# Altium footprint library 1MaxPcb.PcbLib: 187 footprints (part 9 of 12)
Each footprint in its own frame and in the unit in brackets; x right, y up, seen from the top. Pads: shape width x height; smd on the part's side, far side on the other; paste and mask are expansions set on the pad; w line width, h text height; cw(c..) or ccw(c..) is an arc to the next point about the centre after c.
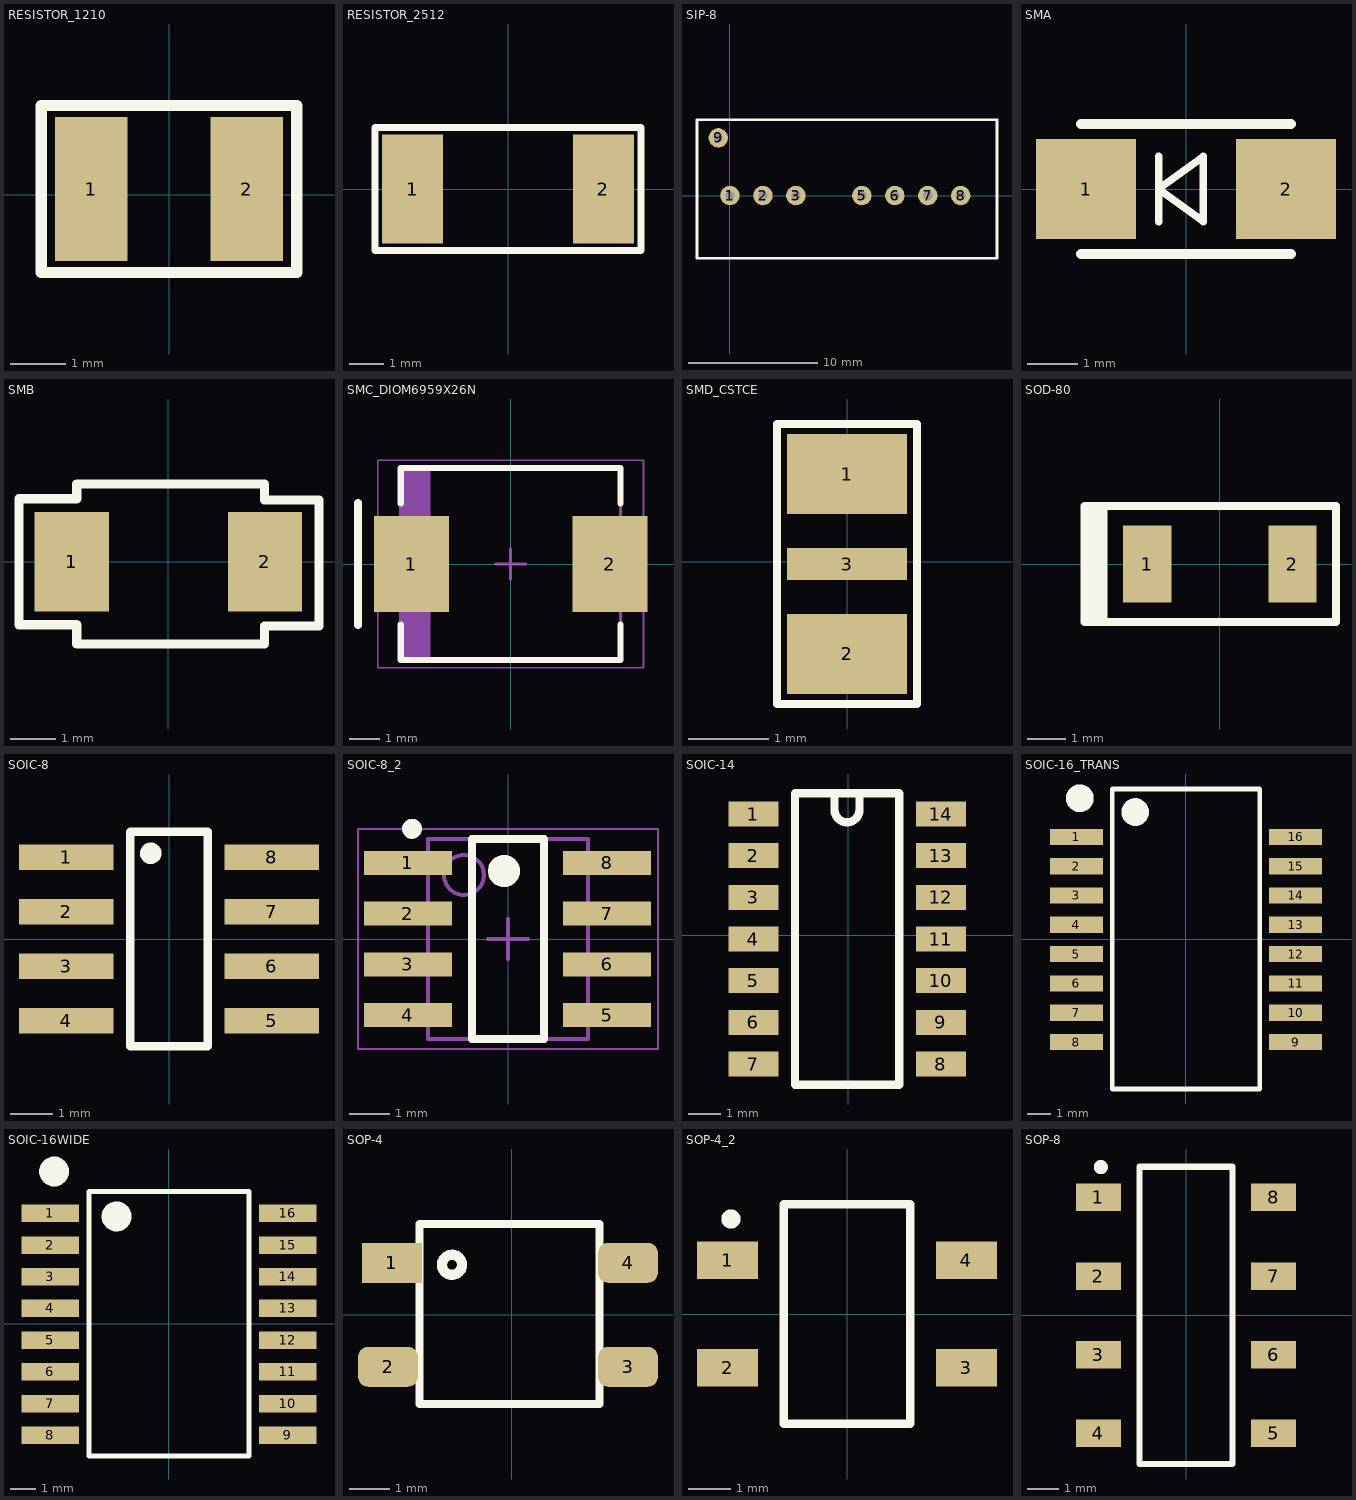
[diagram p8: the footprints below, top view; thin cyan lines are the x and y axes]

## RESISTOR_1210 [mm]
height 0.55
pads (2):
  rect 1.3x2.6 smd mask+0.05: 1(-1.4,0.1) 2(1.4,0.1)
Top Overlay:
  lines w0.2: -2.3,-1.4 -2.3,1.6 2.3,1.6 2.3,-1.4 -2.3,-1.4
3D body "res1210.step": height 0.57, standoff 0, extent -1.55,-1.2 1.55,1.402

## RESISTOR_2512 [mm]
height 0.55
pads (2):
  rect 1.8x3.2 smd mask+0.03: 1(-2.8,0) 2(2.8,0)
Top Overlay:
  lines w0.2: -3.9,-1.8 -3.9,1.8 3.9,1.8 3.9,-1.8 -3.9,-1.8
3D body "res2512.STEP": height 0.57, standoff 0, extent -3.2,-1.6 3.15,1.602

## SIP-8 [mm]
pads (8):
  round 1.5 hole 0.7: 1(0,0) 2(2.54,0) 3(5.08,0) 5(10.16,0) 6(12.7,0) 7(15.24,0) 8(17.78,0) 9(-0.9,4.45)
Top Overlay:
  lines w0.2: -2.54,-4.826 -2.54,5.842 20.574,5.842 20.574,-4.826 -2.54,-4.826
3D body "mdm10h.stp": height 12.2, standoff -2.2, extent -2.108,-4.492 20.192,5.508

## SMA [mm]
pads (2):
  rect 2x2 smd: 1(-2,0) 2(2,0)
Top Overlay:
  lines w0.15: -0.55,-0.65 -0.55,0.65 ; -0.55,0 0.35,0.65 0.35,-0.65 -0.55,0
  lines w0.2: -2.1,-1.3 2.1,-1.3 ; -2.1,1.3 2.1,1.3
3D body "SMA.STEP": height 2.4, standoff 0, extent -2.8,-1.45 2.8,1.45

## SMB [mm]
height 2.45
pads (2):
  rect 1.62x2.18 smd: 1(-2.11,0) 2(2.11,0)
Top Overlay:
  lines w0.2: -3.26,-1.375 -3.26,1.375 -2,1.375 -2,1.7 2.1,1.7 2.1,1.35 3.29,1.35 3.29,-1.4 2.1,-1.4 2.1,-1.8 -2,-1.8 -2,-1.375 -3.26,-1.375
3D body "SMB.STEP": height 2.4, standoff 0, extent -2.75,-1.9 2.85,1.9

## SMC_DIOM6959X26N [mm] "Molded Diode, 2-Leads, Body 6,90x5,90mm, IPC Medium Density"
height 2.62
pads (2):
  rect 2.45x3.15 smd: 1(-3.25,0) 2(3.25,0)
Top Overlay:
  lines w0.2: -3.6,-1.975 -3.6,-3.15 3.6,-3.15 3.6,-1.975 ; -3.6,1.975 -3.6,3.15 3.6,3.15 3.6,1.975
  lines w0.254: -5,-2 -5,2
Mechanical 13:
  rectangle: -3.6,-3.125 -2.632,3.125
  lines w0.1: -3.6,-3.125 -3.6,3.125 3.6,3.125 3.6,-3.125 -3.6,-3.125
Mechanical 15:
  lines w0.05: -4.35,-3.4 -4.35,3.4 4.35,3.4 4.35,-3.4 -4.35,-3.4
  lines w0.1: -0.5,0 0.5,0 ; 0,-0.5 0,0.5
3D body "SMC_DO-214AB.step": height 2.4, standoff 0.03, extent -4.065,-3.05 4.065,3.05

## SMD_CSTCE [mm]
pads (3):
  rect 1.5x1 smd: 1(0,1.1) 2(0,-1.15)
  rect 1.5x0.4 smd: 3(0,-0.025)
Top Overlay:
  lines w0.1: -0.875,-1.775 -0.875,1.725 0.875,1.725 0.875,-1.775 -0.875,-1.775

## SOD-80 [mm]
height 2.67
pads (2):
  rect 1.25x2 smd: 1(-1.875,0) 2(1.875,0)
Top Overlay:
  region: -3.5,1.5 -3.5,-1.5 -3,-1.5 -3,1.5
  lines w0.2: -3,-1.5 -3.5,-1.5 -3.5,1.5 -3,1.5 ; -3,-1.5 3,-1.5 3,1.5 -3,1.5 ; -3,-1.5 -3,1.5
3D body "SOD-80 MiniMELF.stp": height 1.57, standoff -0.03, extent -1.85,-0.8 1.85,0.8

## SOIC-8 [mm]
height 1.73
pads (8):
  rect 2.2x0.6 smd: 1(-2.4,1.905) 2(-2.4,0.635) 3(-2.4,-0.635) 4(-2.4,-1.905) 5(2.4,-1.905) 6(2.4,-0.635) 7(2.4,0.635) 8(2.4,1.905)
Top Overlay:
  circle w0.25: c-0.425,2 r0.125
  lines w0.2: -0.9,-2.5 -0.9,2.5 0.9,2.5 0.9,-2.5 -0.9,-2.5
3D body "SOIC-8.STEP": height 1.7, standoff 0, extent -2.975,-2.54 3.025,2.54

## SOIC-8_2 [mm] "SOIC, 8-Leads, Body 4.9x3.9mm, Pitch 1.27mm, IPC Medium Density"
height 1.75
pads (8):
  rect 2.2x0.6 smd: 1(-2.502,1.905) 2(-2.502,0.635) 3(-2.502,-0.635) 4(-2.502,-1.905) 5(2.476,-1.905) 6(2.476,-0.635) 7(2.476,0.635) 8(2.476,1.905)
Top Overlay:
  circle w0.25: c-2.4,2.755 r0.125
  circle w0.4: c-0.1,1.7 r0.2
  lines w0.2: -0.9,-2.5 -0.9,2.5 0.9,2.5 0.9,-2.5 -0.9,-2.5
Mechanical 13:
  circle w0.1: c-1.1,1.6 r0.5
  lines w0.1: -2,-2.5 -2,2.5 2,2.5 2,-2.5 -2,-2.5
Mechanical 15:
  lines w0.05: -3.75,-2.75 -3.75,2.75 3.75,2.75 3.75,-2.75 -3.75,-2.75
  lines w0.1: -0.5,0 0.5,0 ; 0,-0.5 0,0.5
3D body "User Library-SOIC-8-1.STEP": height 1.75, standoff 0, extent -2.981,-2.455 3.018,2.445

## SOIC-14 [mm]
pads (14):
  rect 1.524x0.762 smd: 1(-2.9,3.7) 2(-2.9,2.43) 3(-2.9,1.16) 4(-2.9,-0.11) 5(-2.9,-1.38) 6(-2.9,-2.65) 7(-2.9,-3.92) 8(2.815,-3.92) 9(2.815,-2.65) 10(2.815,-1.38) 11(2.815,-0.11) 12(2.815,1.16) 13(2.815,2.43) 14(2.815,3.7)
Top Overlay:
  lines w0.254: -0.423,4.335 -0.423,3.827 ccw(c-0.042,3.827) 0.339,3.827 0.339,4.335 ; -1.63,-4.555 -1.63,4.335 1.545,4.335 1.545,-4.555 -1.63,-4.555
3D body "soic-14.stp": height 1.52, standoff -0.08, extent -3.047,-4.418 2.998,4.218

## SOIC-16_TRANS [mm] "TRANSFORMATOR"
height 2.67
pads (16):
  rect 2.3x0.7 smd: 1(-4.75,4.425) 2(-4.75,3.155) 3(-4.75,1.885) 4(-4.75,0.615) 5(-4.75,-0.655) 6(-4.75,-1.925) 7(-4.75,-3.195) 8(-4.75,-4.465) 9(4.75,-4.465) 10(4.75,-3.195) 11(4.75,-1.925) 12(4.75,-0.655) 13(4.75,0.615) 14(4.75,1.885) 15(4.75,3.155) 16(4.75,4.425)
Top Overlay:
  circle w0.6: c-2.2,5.5 r0.3
  circle w0.6: c-4.6,6.1 r0.3
  lines w0.2: -3.2,-6.5 -3.2,6.5 3.2,6.5 3.2,-6.5 -3.2,-6.5
3D body "User Library-frecom ethernet.step": height 5.45, standoff -0.1, extent -4.5,-6.4 4.383,6.4

## SOIC-16WIDE [mm]
height 2.67
pads (16):
  rect 2.3x0.7 smd: 1(-4.75,4.425) 2(-4.75,3.155) 3(-4.75,1.885) 4(-4.75,0.615) 5(-4.75,-0.655) 6(-4.75,-1.925) 7(-4.75,-3.195) 8(-4.75,-4.465) 9(4.75,-4.465) 10(4.75,-3.195) 11(4.75,-1.925) 12(4.75,-0.655) 13(4.75,0.615) 14(4.75,1.885) 15(4.75,3.155) 16(4.75,4.425)
Top Overlay:
  circle w0.6: c-2.1,4.3 r0.3
  circle w0.6: c-4.6,6.1 r0.3
  lines w0.2: -3.2,-5.3 -3.2,5.3 3.2,5.3 3.2,-5.3 -3.2,-5.3
3D body "SOIC-16 Wide.step": height 3.5, standoff 0, extent -5.15,-5.1 5.15,5.1

## SOP-4 [mm] "PRAB31S"
pads (4):
  rect 1.5x1 smd paste+0 mask+0.1: 1(-3,1.3)
  rrect50% 1.5x1 smd paste+0 mask+0.1: 2(-3.1,-1.3) 3(2.9,-1.3) 4(2.9,1.3)
Top Overlay:
  circle w0.254: c-1.5,1.25 r0.25
  lines w0.2: -2.31,-2.23 -2.31,2.27 2.19,2.27 2.19,-2.23 -2.31,-2.23
3D body "SOP-4_2_54.step": height 2.9, standoff 0, extent -3.403,-2.455 3.283,2.495

## SOP-4_2 [mm]
pads (4):
  rect 1.448x0.889 smd: 1(-2.83,1.27) 2(-2.83,-1.27) 3(2.83,-1.27) 4(2.83,1.27)
Top Overlay:
  circle w0.254: c-2.75,2.25 r0.1
  lines w0.2: -1.5,-2.6 -1.5,2.6 1.5,2.6 1.5,-2.6 -1.5,-2.6
3D body "SOP-4_2_54.step": height 2.9, standoff 0, extent -3.268,-2.45 3.418,2.5

## SOP-8 [mm]
pads (8):
  rect 1.448x0.889 smd: 1(-2.83,3.81) 2(-2.83,1.27) 3(-2.83,-1.27) 4(-2.83,-3.81) 5(2.83,-3.81) 6(2.83,-1.27) 7(2.83,1.27) 8(2.83,3.81)
Top Overlay:
  circle w0.254: c-2.75,4.79 r0.1
  lines w0.2: -1.5,-4.8 -1.5,4.8 1.5,4.8 1.5,-4.8 -1.5,-4.8
3D body "sop8-2_54.STEP": height 2.05, standoff 0, extent -3.4,-4.7 3.4,4.7